# Altium footprint library andylib.PcbLib: 158 footprints (part 1 of 10)
Each footprint in its own frame and in the unit in brackets; x right, y up, seen from the top. Pads: shape width x height; smd on the part's side, far side on the other; paste and mask are expansions set on the pad; w line width, h text height; cw(c..) or ccw(c..) is an arc to the next point about the centre after c.
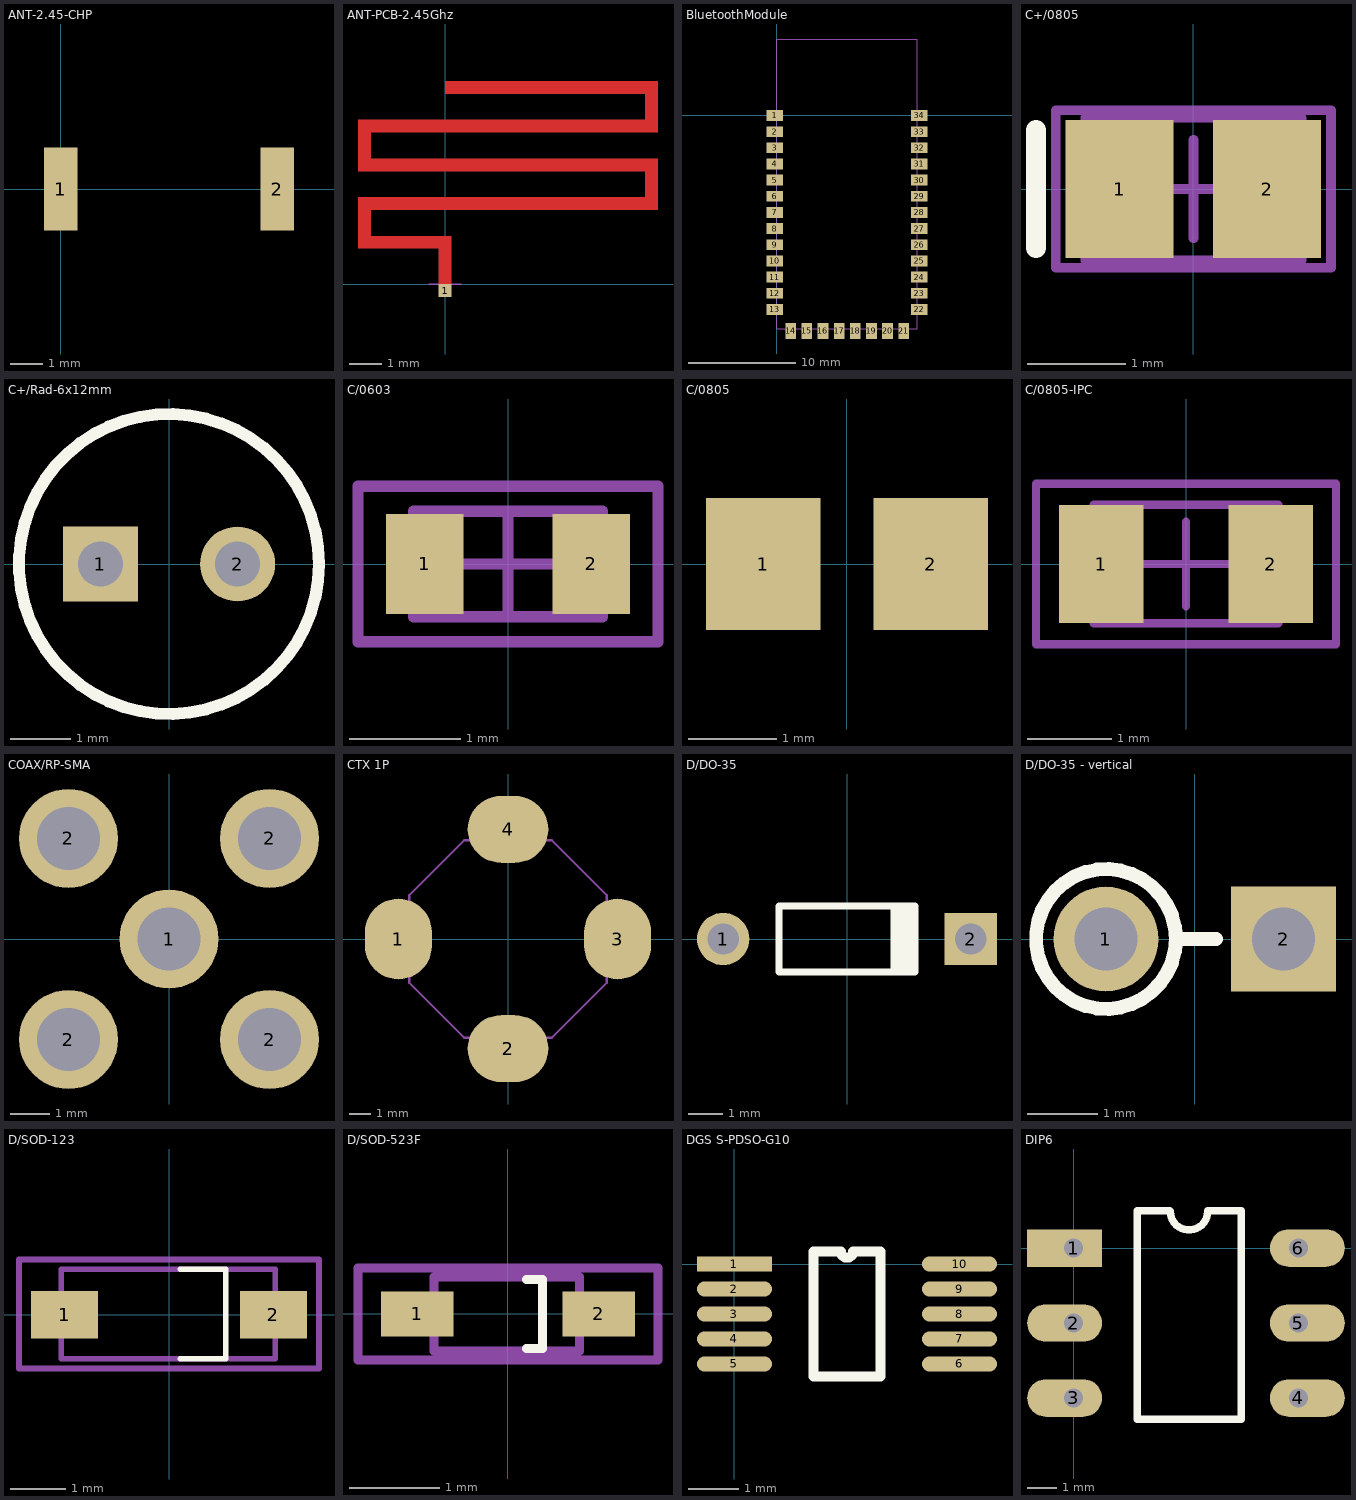
[diagram p0: the footprints below, top view; thin cyan lines are the x and y axes]

## ANT-2.45-CHP [mil] "2.45Ghz Chip Antenna"
height 66.93
pads (2):
  rect 40x100 all layers, no hole: 1(0,0) 2(260,0)

## ANT-PCB-2.45Ghz [mm] "PCB Antenna - #1"
pads (1):
  rect 0.4x0.4 smd paste+0: 1(0,-0.2)
Top Layer:
  rectangle: 0,5.9 6.6,6.3
  rectangle: 6.2,5.1 6.6,5.9
  rectangle: -2.7,4.7 6.6,5.1
  rectangle: -2.7,3.9 -2.3,4.7
  rectangle: -2.7,3.5 6.6,3.9
  rectangle: 6.2,2.7 6.6,3.5
  rectangle: 0,2.3 6.6,2.7
  rectangle: -2.7,2.3 0,2.7
  rectangle: -2.7,1.5 -2.3,2.3
  rectangle: -2.7,1.1 0.2,1.5
  rectangle: -0.2,0 0.2,1.1
Mechanical 13:
  lines w0.05: -0.5,0 0.5,0

## BluetoothModule [mm] "Bluetooth to RS232 Adapter module"
height 5
pads (34):
  rect 1.5x1 smd: 1(-0.2,0) 2(-0.2,-1.5) 3(-0.2,-3) 4(-0.2,-4.5) 5(-0.2,-6) 6(-0.2,-7.5) 7(-0.2,-9) 8(-0.2,-10.5) 9(-0.2,-12) 10(-0.2,-13.5) 11(-0.2,-15) 12(-0.2,-16.5) 13(-0.2,-18) 22(13.2,-18) 23(13.2,-16.5) 24(13.2,-15) 25(13.2,-13.5) 26(13.2,-12) 27(13.2,-10.5) 28(13.2,-9) 29(13.2,-7.5) 30(13.2,-6) 31(13.2,-4.5) 32(13.2,-3) 33(13.2,-1.5) 34(13.2,0)
  rect 1x1.5 smd: 14(1.27,-20) 15(2.77,-20) 16(4.27,-20) 17(5.77,-20) 18(7.27,-20) 19(8.77,-20) 20(10.27,-20) 21(11.77,-20)
Mechanical 13:
  lines w0.1: 0,-19.8 0,7.1 13,7.1 13,-19.8 0,-19.8
3D body: height 2, standoff 0, extent -0.05,-19.85 13.05,7.15

## C+/0805 [mm] "Chip Capacitor, Body 2.0x1.3mm, IPC High Density"
height 1.4
pads (2):
  rect 1.1x1.4 smd: 1(-0.75,0) 2(0.75,0)
Top Overlay:
  lines w0.2: -1.6,-0.6 -1.6,0.6
Mechanical 13:
  lines w0.1: -1.1,-0.725 1.1,-0.725 1.1,0.725 -1.1,0.725 -1.1,-0.725
Mechanical 15:
  lines w0.1: -0.5,0 0.5,0 ; 0,-0.5 0,0.5 ; -1.4,-0.8 1.4,-0.8 1.4,0.8 -1.4,0.8 -1.4,-0.8
3D body: height 0.78, standoff 0, extent -1,-0.6 1,0.65

## C+/Rad-6x12mm [mm] "Capacitor, Electrolytic, Radial; Body 5 x 6.8 mm (Dia.xH typ); Pin Spacing 2 mm (typ)"
pads (2):
  rect 1.25x1.25 hole 0.75: 1(-1.143,0)
  round 1.25 hole 0.75: 2(1.143,0)
Top Overlay:
  circle w0.2: c0,0 r2.5
3D body: height 10.98, standoff -19.02, extent -3.175,-3.15 3.125,3.15

## C/0603 [mm] "Chip Capacitor, Body 1.6x0.8mm, IPC High Density"
height 1.3
pads (2):
  rect 0.7x0.9 smd: 1(-0.75,0) 2(0.75,0)
Mechanical 13:
  lines w0.1: -0.85,-0.475 0.85,-0.475 0.85,0.475 -0.85,0.475 -0.85,-0.475
Mechanical 15:
  lines w0.1: -0.475,0 0.475,0 ; 0,-0.475 0,0.475 ; -1.35,-0.7 1.35,-0.7 1.35,0.7 -1.35,0.7 -1.35,-0.7
3D body: height 0.88, standoff -0.02, extent -1.3,-0.55 1.3,0.45

## C/0805 [mm] "Chip Resistor; Body 2.0 x 1.3 mm (LxW typ)"
height 2.54
pads (2):
  rect 1.3x1.5 smd: 1(-0.95,0) 2(0.95,0)
3D body: height 0.78, standoff 0, extent -1,-0.635 1,0.615

## C/0805-IPC [mm] "Chip Resistor; Body 2.0 x 1.3 mm (LxW typ)"
height 2.54
pads (2):
  rect 1x1.4 smd: 1(-1,0) 2(1,0)
Mechanical 13:
  lines w0.1: -1.09,-0.7 -1.09,0.7 1.09,0.7 1.09,-0.7 -1.09,-0.7
Mechanical 15:
  lines w0.1: -0.5,0 0.5,0 ; 0,-0.5 0,0.5 ; -1.775,-0.95 -1.775,0.95 1.775,0.95 1.775,-0.95 -1.775,-0.95
3D body: height 0.78, standoff 0, extent -1,-0.635 1,0.615

## COAX/RP-SMA [mm] "PCB Mount RP-SMA"
height 12
pads (5):
  round 2.5 hole 1.6: 1(0,0) 2(-2.54,-2.54) 2(-2.54,2.54) 2(2.54,-2.54) 2(2.54,2.54)
3D body: height 9.7, standoff -4, extent -3.25,-3.25 3.25,3.25

## CTX 1P [mm] "Dual SMD Power Inductor"
height 4.2
pads (4):
  oval 3.05x3.68 smd paste+0: 1(-5,0) 3(5,0)
  oval 3.68x3.05 smd paste+0: 2(0,-5) 4(0,5)
Mechanical 13:
  lines w0.1: -4.5,-2 -4.5,2 -2,4.5 2,4.5 4.5,2 4.5,-2 2,-4.5 -2,-4.5 -4.5,-2
3D body: height 4.2, standoff 0, extent -4.501,-4.501 4.501,4.501

## D/DO-35 [mm] "Diode, Axial; Body 3.8 x 1.9 mm (LxDia. max), Lead Dia. 0.53 mm (max)"
height 1.9
pads (2):
  round 1.5 hole 0.9: 1(-3.55,0)
  rect 1.5x1.5 hole 0.9: 2(3.55,0)
Top Overlay:
  rectangle: 1.25,-0.95 2.05,0.95
  lines w0.2: 1.95,-0.95 -1.95,-0.95 -1.95,0.95 1.95,0.95
3D body: height 2.15, standoff -2.54, extent -5.245,-0.902 5.448,0.851

## D/DO-35 - vertical [mm] "Diode, Axial; Body 3.8 x 1.9 mm (LxDia. max), Lead Dia. 0.53 mm (max)"
height 1.9
pads (2):
  round 1.5 hole 0.9: 1(-1.27,0)
  rect 1.5x1.5 hole 0.9: 2(1.27,0)
Top Overlay:
  circle w0.2: c-1.27,0 r1
  lines w0.2: -0.254,0 0.305,0
3D body: height 4.62, standoff -1.9, extent -2.095,-0.825 1.486,0.825

## D/SOD-123 [mm]
pads (2):
  rect 1.2x0.85 smd: 1(-1.875,0) 2(1.875,0)
Top Overlay:
  lines w0.1: 0.203,-0.787 1.016,-0.787 1.016,0.813 0.203,0.813
Mechanical 13:
  lines w0.1: -1.93,-0.787 1.905,-0.787 1.905,0.813 -1.93,0.813 -1.93,-0.787
Mechanical 15:
  lines w0.1: -2.692,-0.965 2.692,-0.965 2.692,0.991 -2.692,0.991 -2.692,-0.965
3D body: height 1.45, standoff 0, extent -1.9,-0.838 1.95,0.862

## D/SOD-523F [mm]
pads (2):
  rect 0.8x0.5 smd: 1(-1,0) 2(1,0)
Top Overlay:
  lines w0.1: 0.203,-0.381 0.381,-0.381 0.381,0.381 0.203,0.381
Mechanical 13:
  lines w0.1: -0.813,-0.406 0.787,-0.406 0.787,0.406 -0.813,0.406 -0.813,-0.406
Mechanical 15:
  lines w0.1: -1.651,-0.508 1.651,-0.508 1.651,0.508 -1.651,0.508 -1.651,-0.508
3D body: height 0.7, standoff 0, extent -0.8,-0.399 0.8,0.399

## DGS S-PDSO-G10 [mm]
pads (10):
  rect 1.5x0.3 smd: 1(0,0)
  oval 1.5x0.3 smd: 2(0,-0.5) 3(0,-1) 4(0,-1.5) 5(0,-2) 6(4.5,-2) 7(4.5,-1.5) 8(4.5,-1) 9(4.5,-0.5) 10(4.5,0)
Top Overlay:
  lines w0.2: 1.585,-2.25 1.585,0.25 2.125,0.25 ccw(c2.25,0.25) 2.375,0.25 2.915,0.25 2.915,-2.25 1.585,-2.25

## DIP6 [mm]
pads (6):
  rect 2.54x1.27 hole 0.635 copper offset -0.3,0: 1(0,0)
  oval 2.54x1.27 hole 0.635 copper offset -0.3,0: 2(0,-2.54) 3(0,-5.08)
  oval 2.54x1.27 hole 0.635 copper offset 0.3,0: 4(7.62,-5.08) 5(7.62,-2.54) 6(7.62,0)
Top Overlay:
  lines w0.254: 3.251,1.27 2.159,1.27 2.159,-5.8 5.69,-5.8 5.69,1.27 ; 3.277,1.245 ccw(c3.912,1.245) 4.547,1.245 ; 4.547,1.27 5.639,1.27
3D body: height 8.36, standoff -4.46, extent -1.245,-8.763 8.814,1.295